# Altium schematic symbol library MCU_ST_STM32H7.SchLib: 191 symbols (part 8 of 8)
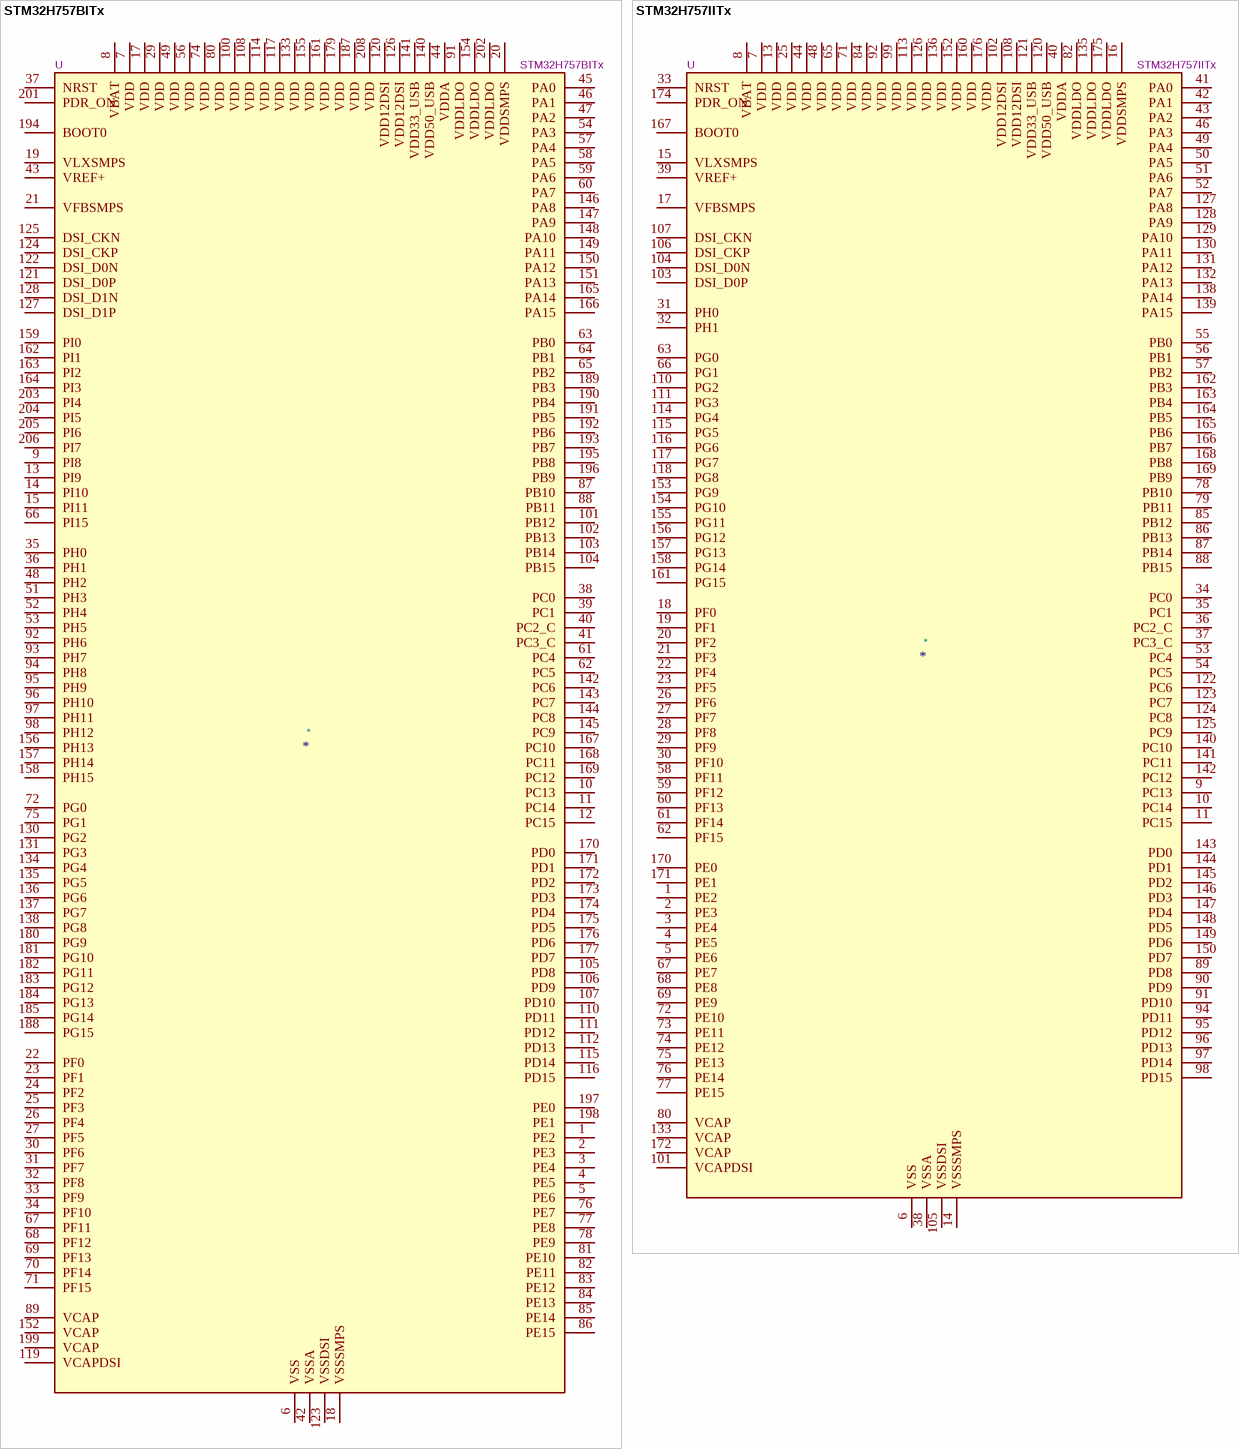
[diagram p73: symbols STM32H757BITx to STM32H757IITx]

## STM32H757IITx
designator *  value STM32H757IITx  Reference: U
ki_keywords: Arm Cortex-M7 STM32H7 STM32H747/757; ki_description: STMicroelectronics Arm Cortex-M7 MCU, 2048KB flash, 1024KB RAM, 480 MHz, 1.62-3.6V, 114 GPIO, LQFP176; ki_fp_filters: LQFP*24x24mm*P0.5mm*; Footprint: Package_QFP:LQFP-176_24x24mm_P0.5mm; Datasheet: https://www.st.com/resource/en/datasheet/stm32h757ii.pdf
pins: 1 PE2, 2 PE3, 3 PE4, 4 PE5, 5 PE6, 6 VSS, 7 VDD, 8 VBAT, 9 PC13, 10 PC14, 11 PC15, 12 VSS hidden, 13 VDD, 14 VSSSMPS, 15 VLXSMPS, 16 VDDSMPS, 17 VFBSMPS, 18 PF0, 19 PF1, 20 PF2, 21 PF3, 22 PF4, 23 PF5, 24 VSS hidden, 25 VDD, 26 PF6, 27 PF7, 28 PF8, 29 PF9, 30 PF10, 31 PH0, 32 PH1, 33 NRST, 34 PC0, 35 PC1, 36 PC2_C, 37 PC3_C, 38 VSSA, 39 VREF+, 40 VDDA, 41 PA0, 42 PA1, 43 PA2, 44 VDD, 45 VSS hidden, 46 PA3, 47 VSS hidden, 48 VDD, 49 PA4, 50 PA5, 51 PA6, 52 PA7, 53 PC4, 54 PC5, 55 PB0, 56 PB1, 57 PB2, 58 PF11, 59 PF12, 60 PF13, 61 PF14, 62 PF15, 63 PG0, 64 VSS hidden, 65 VDD, 66 PG1, 67 PE7, 68 PE8, 69 PE9, 70 VSS hidden, 71 VDD, 72 PE10, 73 PE11, 74 PE12, 75 PE13, 76 PE14, 77 PE15, 78 PB10, 79 PB11, 80 VCAP, 81 VSS hidden, 82 VDDLDO, 83 VSS hidden, 84 VDD, 85 PB12, 86 PB13, 87 PB14, 88 PB15, 89 PD8, 90 PD9, 91 PD10, 92 VDD, 93 VSS hidden, 94 PD11, 95 PD12, 96 PD13, 97 PD14, 98 PD15, 99 VDD, 100 VSS hidden, 101 VCAPDSI, 102 VDD12DSI, 103 DSI_D0P, 104 DSI_D0N, 105 VSSDSI, 106 DSI_CKP, 107 DSI_CKN, 108 VDD12DSI, 109 VSSDSI hidden, 110 PG2, 111 PG3, 112 VSS hidden, 113 VDD, 114 PG4, 115 PG5, 116 PG6, 117 PG7, 118 PG8, 119 VSS hidden, 120 VDD50_USB, 121 VDD33_USB, 122 PC6, 123 PC7, 124 PC8, 125 PC9, 126 VDD, 127 PA8, 128 PA9, 129 PA10, 130 PA11, 131 PA12, 132 PA13, 133 VCAP, 134 VSS hidden, 135 VDDLDO, 136 VDD, 137 VSS hidden, 138 PA14, 139 PA15, 140 PC10, 141 PC11, 142 PC12, 143 PD0, 144 PD1, 145 PD2, 146 PD3, 147 PD4, 148 PD5, 149 PD6, 150 PD7, 151 VSS hidden, 152 VDD, 153 PG9, 154 PG10, 155 PG11, 156 PG12, 157 PG13, 158 PG14, 159 VSS hidden, 160 VDD, 161 PG15, 162 PB3, 163 PB4, 164 PB5, 165 PB6, 166 PB7, 167 BOOT0, 168 PB8, 169 PB9, 170 PE0, 171 PE1, 172 VCAP, 173 VSS hidden, 174 PDR_ON, 175 VDDLDO, 176 VDD

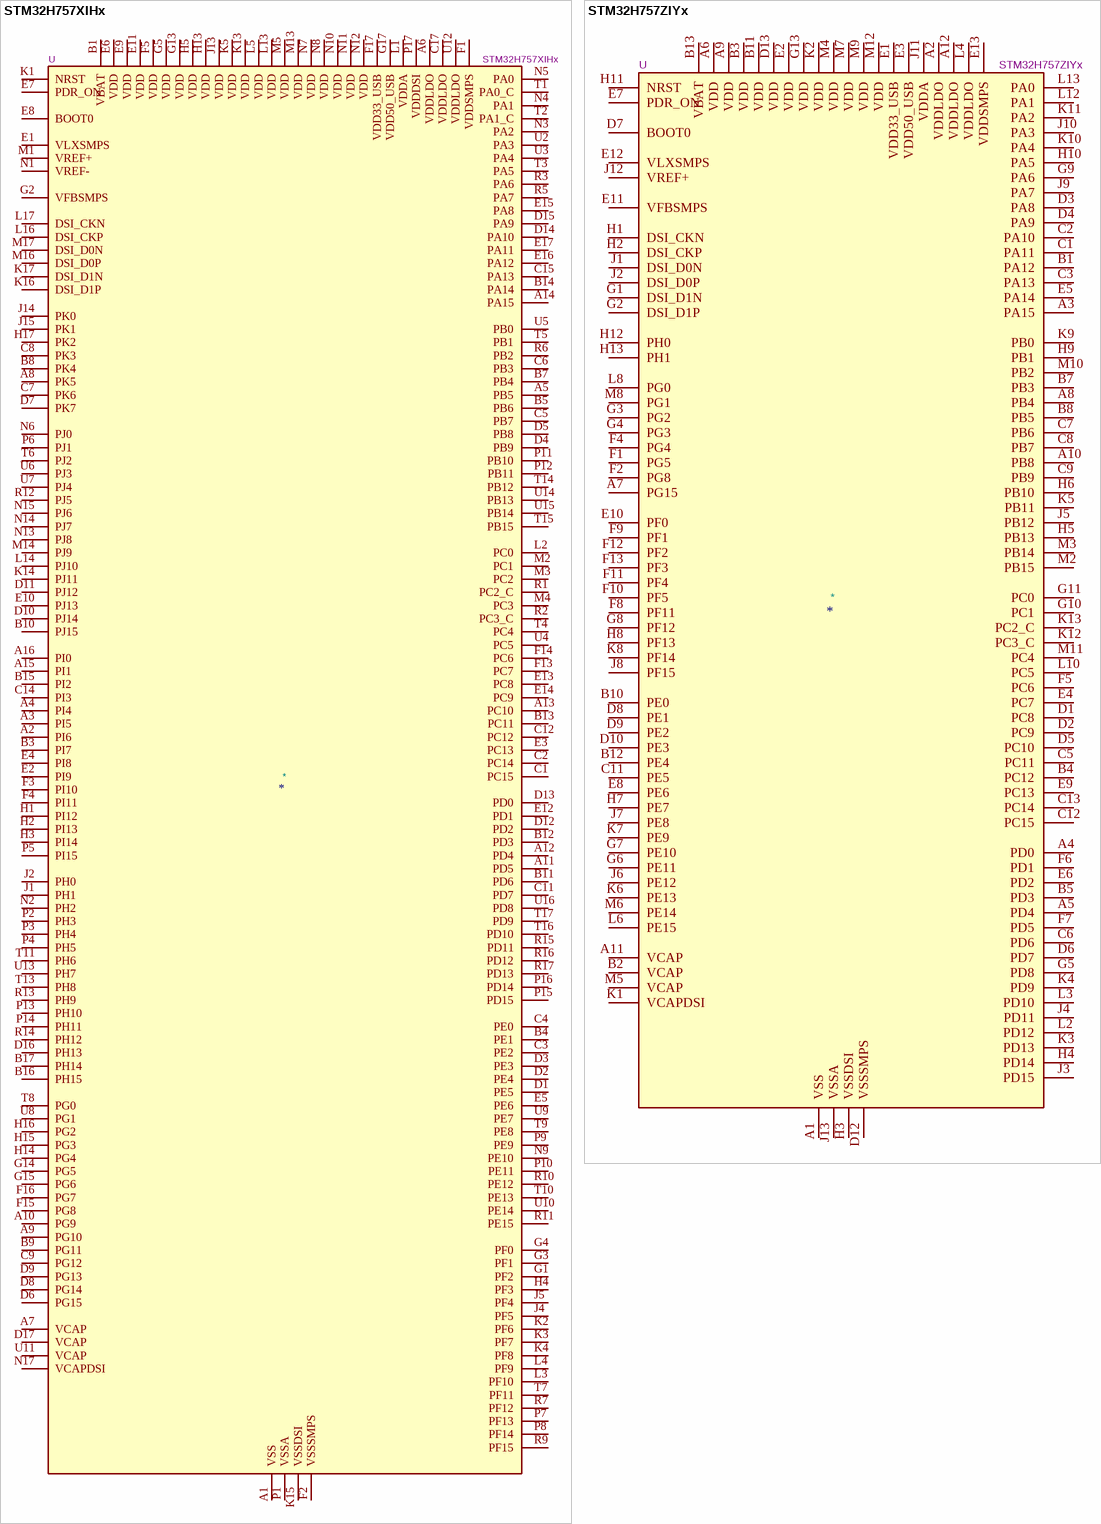
[diagram p66: symbols STM32H757XIHx to STM32H757ZIYx]

## STM32H757XIHx
designator *  value STM32H757XIHx  Reference: U
ki_keywords: Arm Cortex-M7 STM32H7 STM32H747/757; ki_description: STMicroelectronics Arm Cortex-M7 MCU, 2048KB flash, 1024KB RAM, 480 MHz, 1.62-3.6V, 172 GPIO, TFBGA240; ki_fp_filters: TFBGA*14x14mm*Layout17x17*P0.8mm*; Footprint: Package_BGA:TFBGA-265_14x14mm_Layout17x17_P0.8mm; Datasheet: https://www.st.com/resource/en/datasheet/stm32h757xi.pdf
pins: A1 VSS, A2 PI6, A3 PI5, A4 PI4, A5 PB5, A6 VDDLDO, A7 VCAP, A8 PK5, A9 PG10, A10 PG9, A11 PD5, A12 PD4, A13 PC10, A14 PA15, A15 PI1, A16 PI0, A17 VSS hidden, B1 VBAT, B2 VSS hidden, B3 PI7, B4 PE1, B5 PB6, B6 VSS hidden, B7 PB4, B8 PK4, B9 PG11, B10 PJ15, B11 PD6, B12 PD3, B13 PC11, B14 PA14, B15 PI2, B16 PH15, B17 PH14, C1 PC15, C2 PC14, C3 PE2, C4 PE0, C5 PB7, C6 PB3, C7 PK6, C8 PK3, C9 PG12, C10 VSS hidden, C11 PD7, C12 PC12, C13 VSS hidden, C14 PI3, C15 PA13, C16 VSS hidden, C17 VDDLDO, D1 PE5, D2 PE4, D3 PE3, D4 PB9, D5 PB8, D6 PG15, D7 PK7, D8 PG14, D9 PG13, D10 PJ14, D11 PJ12, D12 PD2, D13 PD0, D14 PA10, D15 PA9, D16 PH13, D17 VCAP, E1 VLXSMPS, E2 PI9, E3 PC13, E4 PI8, E5 PE6, E6 VDD, E7 PDR_ON, E8 BOOT0, E9 VDD, E10 PJ13, E11 VDD, E12 PD1, E13 PC8, E14 PC9, E15 PA8, E16 PA12, E17 PA11, F1 VDDSMPS, F2 VSSSMPS, F3 PI10, F4 PI11, F5 VDD, F13 PC7, F14 PC6, F15 PG8, F16 PG7, F17 VDD33_USB, G1 PF2, G2 VFBSMPS, G3 PF1, G4 PF0, G5 VDD, G7 VSS hidden, G8 VSS hidden, G9 VSS hidden, G10 VSS hidden, G11 VSS hidden, G13 VDD, G14 PG5, G15 PG6, G16 VSS hidden, G17 VDD50_USB, H1 PI12, H2 PI13, H3 PI14, H4 PF3, H5 VDD, H7 VSS hidden, H8 VSS hidden, H9 VSS hidden, H10 VSS hidden, H11 VSS hidden, H13 VDD, H14 PG4, H15 PG3, H16 PG2, H17 PK2, J1 PH1, J2 PH0, J3 VSS hidden, J4 PF5, J5 PF4, J7 VSS hidden, J8 VSS hidden, J9 VSS hidden, J10 VSS hidden, J11 VSS hidden, J13 VDD, J14 PK0, J15 PK1, J16 VSS hidden, J17 VSS hidden, K1 NRST, K2 PF6, K3 PF7, K4 PF8, K5 VDD, K7 VSS hidden, K8 VSS hidden, K9 VSS hidden, K10 VSS hidden, K11 VSS hidden, K13 VDD, K14 PJ11, K15 VSSDSI, K16 DSI_D1P, K17 DSI_D1N, L1 VDDA, L2 PC0, L3 PF10, L4 PF9, L5 VDD, L7 VSS hidden, L8 VSS hidden, L9 VSS hidden, L10 VSS hidden, L11 VSS hidden, L13 VDD, L14 PJ10, L15 VSSDSI hidden, L16 DSI_CKP, L17 DSI_CKN, M1 VREF+, M2 PC1, M3 PC2, M4 PC3, M5 VDD, M13 VDD, M14 PJ9, M15 VSSDSI hidden, M16 DSI_D0P, M17 DSI_D0N, N1 VREF-, N2 PH2, N3 PA2, N4 PA1, N5 PA0, N6 PJ0, N7 VDD, N8 VDD, N9 PE10, N10 VDD, N11 VDD, N12 VDD, N13 PJ8, N14 PJ7, N15 PJ6, N16 VSS hidden, N17 VCAPDSI, P1 VSSA, P2 PH3, P3 PH4, P4 PH5, P5 PI15, P6 PJ1, P7 PF13, P8 PF14, P9 PE9, P10 PE11, P11 PB10, P12 PB11, P13 PH10, P14 PH11, P15 PD15, P16 PD14, P17 VDDDSI, R1 PC2_C, R2 PC3_C, R3 PA6, R4 VSS hidden, R5 PA7, R6 PB2, R7 PF12, R8 VSS hidden, R9 PF15, R10 PE12, R11 PE15, R12 PJ5, R13 PH9, R14 PH12, R15 PD11, R16 PD12, R17 PD13, T1 PA0_C, T2 PA1_C, T3 PA5, T4 PC4, T5 PB1, T6 PJ2, T7 PF11, T8 PG0, T9 PE8, T10 PE13, T11 PH6, T12 VSS hidden, T13 PH8, T14 PB12, T15 PB15, T16 PD10, T17 PD9, U1 VSS hidden, U2 PA3, U3 PA4, U4 PC5, U5 PB0, U6 PJ3, U7 PJ4, U8 PG1, U9 PE7, U10 PE14, U11 VCAP, U12 VDDLDO, U13 PH7, U14 PB13, U15 PB14, U16 PD8, U17 VSS hidden

## STM32H757ZIYx
designator *  value STM32H757ZIYx  Reference: U
ki_keywords: Arm Cortex-M7 STM32H7 STM32H747/757; ki_description: STMicroelectronics Arm Cortex-M7 MCU, 2048KB flash, 1024KB RAM, 480 MHz, 1.62-3.6V, 101 GPIO, WLCSP156; Footprint: Package_CSP:ST_WLCSP-156_4.96x4.64mm_Layout13x12_P0.35mm; Datasheet: https://www.st.com/resource/en/datasheet/stm32h757zi.pdf; ki_fp_filters: *
pins: A1 VSS, A2 VDDLDO, A3 PA15, A4 PD0, A5 PD4, A6 VDD, A7 PG15, A8 PB4, A9 VDD, A10 PB8, A11 VCAP, A12 VDDLDO, A13 DNC hidden, B1 PA12, B2 VCAP, B3 VDD, B4 PC12, B5 PD3, B6 VSS hidden, B7 PB3, B8 PB5, B9 VSS hidden, B10 PE0, B11 VDD, B12 PE4, B13 VBAT, C1 PA11, C2 PA10, C3 PA13, C4 VSS hidden, C5 PC11, C6 PD6, C7 PB6, C8 PB7, C9 PB9, C10 VSS hidden, C11 PE5, C12 PC15, C13 PC14, D1 PC8, D2 PC9, D3 PA8, D4 PA9, D5 PC10, D6 PD7, D7 BOOT0, D8 PE1, D9 PE2, D10 PE3, D11 VSS hidden, D12 VSSSMPS, D13 VDD, E1 VDD33_USB, E2 VDD, E3 VDD50_USB, E4 PC7, E5 PA14, E6 PD2, E7 PDR_ON, E8 PE6, E9 PC13, E10 PF0, E11 VFBSMPS, E12 VLXSMPS, E13 VDDSMPS, F1 PG5, F2 PG8, F3 VSS hidden, F4 PG4, F5 PC6, F6 PD1, F7 PD5, F8 PF11, F9 PF1, F10 PF5, F11 PF4, F12 PF2, F13 PF3, G1 DSI_D1N, G2 DSI_D1P, G3 PG2, G4 PG3, G5 PD8, G6 PE11, G7 PE10, G8 PF12, G9 PA6, G10 PC1, G11 PC0, G12 VSS hidden, G13 VDD, H1 DSI_CKN, H2 DSI_CKP, H3 VSSDSI, H4 PD14, H5 PB13, H6 PB10, H7 PE7, H8 PF13, H9 PB1, H10 PA5, H11 NRST, H12 PH0, H13 PH1, J1 DSI_D0N, J2 DSI_D0P, J3 PD15, J4 PD11, J5 PB12, J6 PE12, J7 PE8, J8 PF15, J9 PA7, J10 PA3, J11 VDDA, J12 VREF+, J13 VSSA, K1 VCAPDSI, K2 VDD, K3 PD13, K4 PD9, K5 PB11, K6 PE13, K7 PE9, K8 PF14, K9 PB0, K10 PA4, K11 PA2, K12 PC3_C, K13 PC2_C, L1 VSS hidden, L2 PD12, L3 PD10, L4 VDDLDO, L5 VSS hidden, L6 PE15, L7 VSS hidden, L8 PG0, L9 VSS hidden, L10 PC5, L11 VSS hidden, L12 PA1, L13 PA0, M1 VSS hidden, M2 PB15, M3 PB14, M4 VDD, M5 VCAP, M6 PE14, M7 VDD, M8 PG1, M9 VDD, M10 PB2, M11 PC4, M12 VDD, M13 VSS hidden